# Altium schematic symbol library BARKO_SCHLIB.SchLib: 1064 symbols (part 1 of 11) (continued)
## C-220NF-1812 (continued)
CAP CER 0.22UF 100V X7R 1812; Manufacturer: KEMET; Manufacturer Part Number: C1812C224K1RACTU; Dielectric Material: Ceramic; Tolerance: 10%; Dissipation Factor: 2.5%; .PCBCHK: USED; .Creator: F:TALI; Washability: OK; Stock 1: 2000; Pricing 1: 1=1.08, 10=0.822, 100=0.5882, 500=0.4554 (USD); Mount: Surface Mount; Case Code (Metric): 4532; Case Code (Imperial): 1812; Min Operating Temperature: -55°C; Max Operating Temperature: 125°C; Capacitance: 220nF; Packaging: Tape and Reel; Package Quantity: 1000; Voltage Rating (DC): 100V; Dielectric: X7R; Termination: SMD/SMT; Voltage: 100V; Length: 4.5mm; Height: 1mm; Width: 0.126inch; Thickness: 0.043inch; Depth: 3.2mm; ComponentLink1URL: http://www.mouser.com/ds/2/212/KEM_C1002_X7R_SMD-1102033.pdf; ComponentLink1Description: http://www.mouser.com/ds/2/212/KEM_C1002_X7R_SMD-1102033.pdf; Stock 2: 4970; Pricing 2: 1=1.02, 10=0.773, 100=0.5533, 500=0.42836 (USD); Weight: 0.000952oz; Composition: Ceramic; Radiation Hardening: No; Lead Free: Lead Free; ComponentLink2URL: https://www.verical.com/server-webapp/html/getDatasheet?partID=403886; ComponentLink2Description: https://www.verical.com/server-webapp/html/getDatasheet?partID=403886; ComponentLink3URL: http://www.yageo.com/documents/recent/UPY-NP0X7R_MV_100-to-630V_9.pdf; ComponentLink3Description: http://www.yageo.com/documents/recent/UPY-NP0X7R_MV_100-to-630V_9.pdf; ComponentLink4URL: http://www.mouser.com/ds/2/447/Yageo_UPY-GP_NP0_16V-to-50V_9-358835.pdf; ComponentLink4Description: http://www.mouser.com/ds/2/447/Yageo_UPY-GP_NP0_16V-to-50V_9-358835.pdf; Stock 3: 2410; Pricing 3: 1=1.59, 10=1.252, 100=0.939, 500=0.70944 (USD); Features: Soft Termination; .SCHCHK: USED; Supplier 1: Digi-Key; Supplier Part Number 1: 399-9430-6-ND
pins: 1, 2

## C-220PF-0603
designator C?, comment 220PF  Voltage Rating: 50V  Case/Package: 0603
CAP CER 220PF 50V X7R 0603; Manufacturer: Samsung; Manufacturer Part Number: CL10B221JB8NNNC; Tolerance: 5%; Dielectric Material: Ceramic; Dissipation Factor: 2.5%; .PCBCHK: USED; .Creator: F:TALI; Washability: OK; Stock 1: 20; Pricing 1: 1=0.1, 10=0.068, 100=0.0305, 500=0.02178, 1000=0.01712 (USD); Mount: Surface Mount; Case Code (Metric): 1608; Min Operating Temperature: -55°C; Max Operating Temperature: 125°C; Packaging: Tape and Reel; Capacitance: 220pF; Package Quantity: 1; Dielectric: X7R; Voltage Rating (DC): 50V; Length: 1.6mm; Height: 0.8mm; Width: 0.031inch; Thickness: 0.035inch; Depth: 0.8mm; Radiation Hardening: No; ComponentLink1URL: https://www.verical.com/server-webapp/html/getDatasheet?partID=781787; ComponentLink1Description: https://www.verical.com/server-webapp/html/getDatasheet?partID=781787; Case Code (Imperial): 0603; Stock 2: 12000; Pricing 2: 1=0.13, 10=0.095, 100=0.0422, 500=0.03012, 1000=0.02367 (USD); Weight: 7.1E-05oz; Termination: SMD/SMT; Composition: Ceramic; Lead Free: Lead Free; Halogen Free: Halogen Free; ComponentLink2URL: http://www.yageo.com/documents/recent/UPY-GPHC_X7R_6.3V-to-50V_8.pdf; ComponentLink2Description: http://www.yageo.com/documents/recent/UPY-GPHC_X7R_6.3V-to-50V_8.pdf; Stock 3: 1679; Pricing 3: 1=0.51, 10=0.351, 100=0.2105, 500=0.15784, 1000=0.13329 (USD); Lead Pitch: 0.7mm; ComponentLink3URL: http://www.mouser.com/ds/2/212/KEM_C1002_X7R_SMD-1102033.pdf; ComponentLink3Description: http://www.mouser.com/ds/2/212/KEM_C1002_X7R_SMD-1102033.pdf; .SCHCHK: USED; Supplier 1: Digi-Key; Supplier Part Number 1: 1276-1985-6-ND
footprint C-0603
pins: 1, 2

## C-220UF-RADIAL SMD
designator C?, comment 220UF  Case/Package: Radial  Voltage Rating: 16V
CAP ALUM 220UF 20% 16V SMD; Manufacturer: Panasonic; Manufacturer Part Number: EEE-1CA221UP; Ripple Current (AC): 280mA; Life (Hours): 2000Hour; Leakage Current: 3uA; Dielectric Material: Aluminium; Impedance: 180mR; Dissipation Factor: 0.16%; .PCBCHK: USED; .Creator: F:TALI; Washability: OK; Stock 1: 69049; Pricing 1: 1=0.48, 10=0.339, 100=0.223, 500=0.16518 (USD); Mount: PCB,Surface Mount; Min Operating Temperature: -40°C; Max Operating Temperature: 85°C; Capacitance: 220uF; Tolerance: 20%; Packaging: Tape and Reel; Package Quantity: 1; Voltage Rating (DC): 16V; Termination: SMD/SMT; Voltage: 16V; Ripple Current: 280mA; Diameter: 6.3mm; Length: 6.5mm; Height: 10.2mm; Height - Seated (Max): 0.244inch; REACH SVHC: Unknown; Lead Free: Lead Free; ComponentLink1URL: http://www.farnell.com/datasheets/1800489.pdf; ComponentLink1Description: http://www.farnell.com/datasheets/1800489.pdf; ComponentLink2URL: http://components.arrow.com/part/dataview/41790773S9646858N1386; ComponentLink2Description: http://components.arrow.com/part/dataview/41790773S9646858N1386; Stock 2: 2294; Pricing 2: 1=0.75, 10=0.531, 100=0.3495, 500=0.25888 (USD); Number of Pins: 2; ESR (Equivalent Series Resistance): 180mR; ComponentLink3URL: http://nichicon-us.com/english/products/pdfs/e-ucl.pdf; ComponentLink3Description: http://nichicon-us.com/english/products/pdfs/e-ucl.pdf; Stock 3: 18022; Pricing 3: 1=0.77, 10=0.571, 100=0.3912, 500=0.30972 (USD); Contact Plating: Tin; Lead Pitch: 2.2mm; Radiation Hardening: No; ComponentLink4URL: http://www.farnell.com/datasheets/2059678.pdf; ComponentLink4Description: http://www.farnell.com/datasheets/2059678.pdf; ComponentLink5URL: http://uk.rs-online.com/webdocs/0df0/0900766b80df09a1.pdf; ComponentLink5Description: http://uk.rs-online.com/webdocs/0df0/0900766b80df09a1.pdf; ComponentLink6URL: http://www.farnell.com/datasheets/2244690.pdf; ComponentLink6Description: http://www.farnell.com/datasheets/2244690.pdf; ComponentLink7URL: https://www.alliedelec.com/m/d/f9a8f3530578bb19547681b1320b60ff.pdf; ComponentLink7Description: https://www.alliedelec.com/m/d/f9a8f3530578bb19547681b1320b60ff.pdf; ComponentLink8URL: http://industrial.panasonic.com/www-data/pdf/ABA0000/ABA0000CE114.pdf; ComponentLink8Description: http://industrial.panasonic.com/www-data/pdf/ABA0000/ABA0000CE114.pdf; ComponentLink9URL: https://www.distrelec.biz/Web/Downloads/_t/ds/fp_eng_tds.pdf?mime=application%2Fpdf; ComponentLink9Description: https://www.distrelec.biz/Web/Downloads/_t/ds/fp_eng_tds.pdf?mime=application%2Fpdf; .SCHCHK: USED; Supplier 1: Digi-Key; Supplier Part Number 1: PCE3884DKR-ND
footprint C-E-8.3x8.3x10.2
pins: 1, 2
text: +

## C-220UF-TANTB
designator C?, comment 220uF  Case/Package: 1411
CAP TANT 220UF 10% 6.3V 1411; Manufacturer: Kyocera AVX; Manufacturer Part Number: F930J227KBA; Washability: OK; .Creator: M.OZKAN; .PCBCHK: USED; ESR (Equivalent Series Resistance): 1.2R; Life (Hours): 2000Hour; .SCHCHK: USED; Supplier 1: Digi-Key; Supplier Part Number 1: 478-8166-1-ND; Stock: 10160; Pricing: 1=0.78, 10=0.572, 50=0.4576, 100=0.3922, 500=0.3105, 1000=0.2614 (USD); RoHS: No; Mount: Surface Mount; Case Code (Imperial): 1411; Case Code (Metric): 3528; Min Operating Temperature: -55°C; Max Operating Temperature: 125°C; Features: General Purpose; Packaging: Tape and Reel; Capacitance: 220uF; Tolerance: 10%; Voltage Rating: 6.3V; ComponentLink1URL: http://www.mouser.com/ds/2/40/f93-776559.pdf?src-supplier=Mouser; ComponentLink1Description: http://www.mouser.com/ds/2/40/f93-776559.pdf?src-supplier=Mouser; ComponentLink2URL: http://datasheets.avx.com/F93.pdf?src-supplier=Digi-Key; ComponentLink2Description: http://datasheets.avx.com/F93.pdf?src-supplier=Digi-Key
footprint C-TANTB-3528
pins: 1, 2
text: +

## C-330PF-0603
designator C?, comment 330PF  Voltage Rating: 100V  Case/Package: 0603
CAP CER 330PF 100V X7R 0603; Manufacturer: Samsung; Manufacturer Part Number: CL10B331KC8WPNC; Tolerance: 10%; .PCBCHK: USED; .Creator: F:TALI; Washability: OK; Stock 1: 0; Pricing 1: 4000=0.01369 (USD); Mount: Surface Mount; Case Code (Metric): 1608; Case Code (Imperial): 0603; Min Operating Temperature: -55°C; Max Operating Temperature: 125°C; Packaging: Cut Tape; Capacitance: 330pF; Features: Soft Termination; Length: 0.063inch; Width: 0.031inch; Thickness: 0.035inch; Ratings: AEC-Q200; Stock 2: 1430; Pricing 2: 1=0.1, 10=0.03, 100=0.0271, 500=0.02396 (USD); Stock 3: 80; Pricing 3: 1=0.14, 10=0.1, 100=0.0443, 500=0.03166, 1000=0.02488 (USD); Weight: 7.1E-05oz; Dielectric: X7R; Voltage Rating (DC): 100V; Termination: SMD/SMT; Composition: Ceramic; Height: 0.8mm; Depth: 0.8mm; Radiation Hardening: No; ComponentLink1URL: http://www.mouser.com/ds/2/447/Yageo_UPY-GP_NP0_16V-to-50V_9-358835.pdf; ComponentLink1Description: http://www.mouser.com/ds/2/447/Yageo_UPY-GP_NP0_16V-to-50V_9-358835.pdf; .SCHCHK: USED; Supplier 1: Digi-Key; Supplier Part Number 1: 732-12199-6-ND
footprint C-0603
pins: 1, 2

## C-330PF-0603_1
designator C?, comment 330PF  Voltage Rating: 50V  Case/Package: 0603
CAP CER 330PF 50V NP0 0603; Manufacturer: KEMET; Manufacturer Part Number: C0603C331J5GACTU; Dielectric Material: Ceramic; Tolerance: 5%; Dielectric: C0G; Temperature Coefficient: 30ppm/°C; Dissipation Factor: 0.5%; .PCBCHK: USED; .Creator: F:TALI; Washability: OK; Stock 1: 0; Pricing 1: 1=0.1, 10=0.073, 100=0.0324, 500=0.02314, 1000=0.01818 (USD); Mount: PCB,Surface Mount; Number of Pins: 2; Contact Plating: Matte,Tin; Case Code (Metric): 1608; Case Code (Imperial): 0603; Contact Material: Tin; Min Operating Temperature: -55°C; Max Operating Temperature: 125°C; Packaging: Tape and Reel; Termination: SMD/SMT; Package Quantity: 1; Voltage Rating (DC): 50V; Voltage: 50V; Length: 1.6mm; Height: 0.8mm; Width: 0.8mm; Depth: 0.8mm; Thickness: 0.034inch; Lead Pitch: 0.7mm; Radiation Hardening: No; REACH SVHC: No SVHC; Lead Free: Lead Free; ComponentLink1URL: https://api.kemet.com/component-edge/download/datasheet/C0603C331J5GACTU.pdf; ComponentLink1Description: https://api.kemet.com/component-edge/download/datasheet/C0603C331J5GACTU.pdf; ComponentLink2URL: https://www.alliedelec.com/m/d/9bfe7773041ffe9d406e68bc7b377fdd.pdf; ComponentLink2Description: https://www.alliedelec.com/m/d/9bfe7773041ffe9d406e68bc7b377fdd.pdf; ComponentLink3URL: http://www.kemet.com/kemet/web/homepage/kechome.nsf/file/Commercial%20Ceramic%20Chips%20NP0%20-%20C0G%20Dielectric/$file/KEM_C1003_C0G_SMD.pdf; ComponentLink3Description: http://www.kemet.com/kemet/web/homepage/kechome.nsf/file/Commercial%20Ceramic%20Chips%20NP0%20-%20C0G%20Dielectric/$file/KEM_C1003_C0G_SMD.pdf; Capacitance: 330pF; Stock 2: 4; Pricing 2: 1=0.1, 10=0.07, 100=0.031, 500=0.02214, 1000=0.01739 (USD); ComponentLink4URL: http://www.samsungsem.com/kr/support/product-search/mlcc/CL10C331JB8NFNC.jsp; ComponentLink4Description: http://www.samsungsem.com/kr/support/product-search/mlcc/CL10C331JB8NFNC.jsp; Stock 3: 2878; Pricing 3: 1=0.1, 10=0.038, 100=0.0345, 500=0.0305 (USD); .SCHCHK: USED; Supplier 1: Digi-Key; Supplier Part Number 1: 399-1068-6-ND
footprint C-0603
pins: 1, 2

## C-330UF-RADIAL SMD
designator C?, comment 330UF  Voltage Rating: 35V  Case/Package: Radial
CAP ALUM 330UF 20% 35V SMD; Manufacturer: Panasonic; Manufacturer Part Number: EEE-1VA331P; Ripple Current (AC): 350mA; Polarity: Polar; Life (Hours): 2000Hour; Leakage Current: 3uA; Dissipation Factor: 0.3%; Lead Diameter: 0.9mm; Material: Aluminium; ESR (Equivalent Series Resistance): 150mR; .PCBCHK: USED; .Creator: F:TALI; Washability: OK; Stock 1: 26248; Pricing 1: 1=0.65, 10=0.482, 100=0.3304 (USD); Mount: PCB,Surface Mount; Contact Plating: Tin; Min Operating Temperature: -40°C; Max Operating Temperature: 85°C; Capacitance: 330uF; Packaging: Tape and Reel; Tolerance: 20%; Ripple Current: 350mA; Voltage Rating (DC): 35V; Package Quantity: 500; Termination: SMD/SMT; Voltage: 35V; Diameter: 10mm; Length: 10.5mm; Height: 10.2mm; Height - Seated (Max): 0.402inch; Radiation Hardening: No; REACH SVHC: No SVHC; Lead Free: Lead Free; ComponentLink1URL: http://industrial.panasonic.com/www-data/pdf/ABA0000/ABA0000CE2.pdf; ComponentLink1Description: http://industrial.panasonic.com/www-data/pdf/ABA0000/ABA0000CE2.pdf; ComponentLink2URL: http://www.farnell.com/datasheets/2245251.pdf; ComponentLink2Description: http://www.farnell.com/datasheets/2245251.pdf; ComponentLink3URL: https://www.alliedelec.com/m/d/310b2cfd0553a89b5ffae819c6e32d0a.pdf; ComponentLink3Description: https://www.alliedelec.com/m/d/310b2cfd0553a89b5ffae819c6e32d0a.pdf; ComponentLink4URL: http://www.mouser.com/ds/2/315/ABA0000C1145-947633.pdf; ComponentLink4Description: http://www.mouser.com/ds/2/315/ABA0000C1145-947633.pdf; ComponentLink5URL: http://www.industrial.panasonic.com/www-data/pdf/ABA0000/ABA0000CE2.pdf; ComponentLink5Description: http://www.industrial.panasonic.com/www-data/pdf/ABA0000/ABA0000CE2.pdf; ComponentLink6URL: http://www.farnell.com/datasheets/1909355.pdf; ComponentLink6Description: http://www.farnell.com/datasheets/1909355.pdf; Stock 2: 1224; Pricing 2: 1=0.74, 10=0.548, 100=0.3756 (USD); Lead Pitch: 4.6mm; ComponentLink7URL: http://www.farnell.com/datasheets/2059976.pdf; ComponentLink7Description: http://www.farnell.com/datasheets/2059976.pdf; ComponentLink8URL: http://industrial.panasonic.com/www-data/pdf/ABA0000/ABA0000CE115.pdf; ComponentLink8Description: http://industrial.panasonic.com/www-data/pdf/ABA0000/ABA0000CE115.pdf; Stock 3: 21574; Pricing 3: 1=0.8, 10=0.592, 100=0.4057 (USD); Impedance: 150mR; Width: 900um; ComponentLink9URL: http://uk.rs-online.com/webdocs/0e4a/0900766b80e4a876.pdf; ComponentLink9Description: http://uk.rs-online.com/webdocs/0e4a/0900766b80e4a876.pdf; ComponentLink10URL: http://industrial.panasonic.com/www-data/pdf/ABA0000/ABA0000CE5.pdf; ComponentLink10Description: http://industrial.panasonic.com/www-data/pdf/ABA0000/ABA0000CE5.pdf; ComponentLink11URL: https://www.alliedelec.com/m/d/5e395ce182861cdd9b9c36695bed6c89.pdf; ComponentLink11Description: https://www.alliedelec.com/m/d/5e395ce182861cdd9b9c36695bed6c89.pdf; ComponentLink12URL: https://www.alliedelec.com/m/d/ad9eed8922c31d260fc5efb233f3771b.pdf; ComponentLink12Description: https://www.alliedelec.com/m/d/ad9eed8922c31d260fc5efb233f3771b.pdf; .SCHCHK: USED; Supplier 1: Digi-Key; Supplier Part Number 1: PCE3959DKR-ND
pins: 1, 2
text: +

## C-330UF-RADIAL-50V
designator C?, comment 330UF  Voltage Rating: 50V
CAP ALUM 330UF 20% 50V SMD; Manufacturer: Nichicon; Manufacturer Part Number: UCM1H331MNL1GS; Ripple Current: 900mA; Polarity: Polar; Impedance: 120mR; Life (Hours): 2000Hour; Supplier 1: Digi-Key; Supplier Part Number 1: 493-14535-1-ND; Stock: 3199; Pricing: 1=0.92, 10=0.701, 50=0.5824, 100=0.5015 (USD); RoHS: Yes; Mount: Surface Mount; Case/Package: SMD/SMT; Min Operating Temperature: -55°C; Max Operating Temperature: 105°C; Capacitance: 330uF; Voltage Rating (DC): 50V; Tolerance: 20%; Packaging: Tape and Reel; Package Quantity: 500; Termination: SMD/SMT; Voltage: 50V; Diameter: 10mm; Length: 10mm; Height: 10mm; Height - Seated (Max): 0.413inch; Lead Pitch: 4.5mm; Lead Free: Lead Free; ComponentLink1URL: http://www.mouser.com/ds/2/293/e-ucm-883824.pdf?src-supplier=Mouser; ComponentLink1Description: http://www.mouser.com/ds/2/293/e-ucm-883824.pdf?src-supplier=Mouser; ComponentLink2URL: http://uk.rs-online.com/webdocs/13bc/0900766b813bca52.pdf?src-supplier=RSComponents; ComponentLink2Description: http://uk.rs-online.com/webdocs/13bc/0900766b813bca52.pdf?src-supplier=RSComponents; ComponentLink3URL: http://nichicon-us.com/english/products/pdfs/e-ch_ta.pdf?src-supplier=Digi-Key; ComponentLink3Description: http://nichicon-us.com/english/products/pdfs/e-ch_ta.pdf?src-supplier=Digi-Key; ComponentLink4URL: http://nichicon-us.com/english/products/pdfs/e-ucm.pdf?src-supplier=Digi-Key; ComponentLink4Description: http://nichicon-us.com/english/products/pdfs/e-ucm.pdf?src-supplier=Digi-Key
footprint C-E-10.3x10.3x10.5
pins: 1, 2
text: +

## C-330UF-Radial-63V
designator C?, comment 330UF  Case/Package: Radial  Voltage Rating: 63V
CAP ALUM 330UF 20% 63V SMD; Manufacturer: Nichicon; Manufacturer Part Number: UUG1J331MNQ6MS; Ripple Current: 680mA; Life (Hours): 2000Hour; Leakage Current: 4uA; Washability: OK; .Creator: M.OZKAN; .PCBCHK: USED; Supplier 1: Digi-Key; Supplier Part Number 1: 493-7427-1-ND; Stock 1: 133; Pricing 1: 1=1.25000, 10=0.98600 (USD); RoHS: Yes; Mount: Surface Mount; Min Operating Temperature: -40°C; Max Operating Temperature: 85°C; Capacitance: 330uF; Package Quantity: 1; Packaging: Tape and Reel; Voltage Rating (DC): 63V; Tolerance: 20%; Termination: SMD/SMT; Length: 21mm; Height - Seated (Max): 0.866inch; ComponentLink1URL: https://datasheet.ciiva.com/6316/e-ug-6316181.pdf?src-supplier=Digi-Key; ComponentLink1Description: https://datasheet.ciiva.com/6316/e-ug-6316181.pdf?src-supplier=Digi-Key; ComponentLink2URL: https://datasheet.ciiva.com/6316/e-ug-6316175.pdf?src-supplier=Digi-Key; ComponentLink2Description: https://datasheet.ciiva.com/6316/e-ug-6316175.pdf?src-supplier=Digi-Key; .SCHCHK: USED
footprint C-E-12.5X21L
pins: 1, 2
text: +

## C-470NF-0603
designator C?, comment 470NF  Case/Package: 0603  Voltage Rating: 16V
CAP CER 0.47UF 16V X7R 0603; Manufacturer: Samsung; Manufacturer Part Number: CL10B474KO8VPNC; Tolerance: 10%; Dielectric Material: Ceramic; .PCBCHK: USED; .Creator: F:TALI; Washability: OK; Mount: Surface Mount; Case Code (Metric): 1608; Case Code (Imperial): 0603; Min Operating Temperature: -55°C; Max Operating Temperature: 125°C; Packaging: Tape and Reel; Capacitance: 470nF; Features: Soft Termination; Length: 0.063inch; Width: 0.031inch; Thickness: 0.035inch; Ratings: AEC-Q200; Stock 1: 0; Pricing 1: 1=0.24, 10=0.166, 100=0.0839, 500=0.0574, 1000=0.05078 (USD); Contact Plating: Matte,Tin; Dielectric: X7R; Voltage Rating (DC): 16V; Height: 0.8mm; Depth: 0.8mm; Radiation Hardening: No; REACH SVHC: No SVHC; ComponentLink1URL: http://capacitoredge.kemet.com/capedge2/DataSheet?pn=C0603C474K4RACAUTO; ComponentLink1Description: http://capacitoredge.kemet.com/capedge2/DataSheet?pn=C0603C474K4RACAUTO; Stock 2: 4000; Pricing 2: 1=0.13, 10=0.093, 100=0.0438, 500=0.0307, 1000=0.02541 (USD); Number of Pins: 2; Package Quantity: 1; Termination: SMD/SMT; Voltage: 16V; Halogen Free: Halogen Free; ComponentLink2URL: http://www.onlinecomponents.com/productFiles/mf-TAI/398emk107b7474ka-t.pdf; ComponentLink2Description: http://www.onlinecomponents.com/productFiles/mf-TAI/398emk107b7474ka-t.pdf; ComponentLink3URL: http://ds.yuden.co.jp/TYCOMPAS/ut/detail.do?productNo=EMK107B7474KA-T&fileName=EMK107B7474KA-T_SS&mode=specSheetDownload; ComponentLink3Description: http://ds.yuden.co.jp/TYCOMPAS/ut/detail.do?productNo=EMK107B7474KA-T&fileName=EMK107B7474KA-T_SS&mode=specSheetDownload; ComponentLink4URL: https://www.verical.com/server-webapp/html/getDatasheet?partID=638870; ComponentLink4Description: https://www.verical.com/server-webapp/html/getDatasheet?partID=638870; ComponentLink5URL: http://www.farnell.com/datasheets/746258.pdf; ComponentLink5Description: http://www.farnell.com/datasheets/746258.pdf; ComponentLink6URL: http://www.yuden.co.jp/ut/product/category/capacitor/EMK107B7474KA-T.pdf; ComponentLink6Description: http://www.yuden.co.jp/ut/product/category/capacitor/EMK107B7474KA-T.pdf; Stock 3: 40000; Pricing 3: 1=0.14, 10=0.1, 100=0.0472, 500=0.03312, 1000=0.02742 (USD); .SCHCHK: USED; Supplier 1: Digi-Key; Supplier Part Number 1: 1276-6604-6-ND
footprint C-0603
pins: 1, 2

## C-470NF-0603_1
designator C?, comment 470NF  Voltage Rating: 50V  Case/Package: 0603
CAP CER 0.47UF 50V X5R 0603; Manufacturer: Samsung; Manufacturer Part Number: CL10A474KB8NNNC; Tolerance: 10%; .PCBCHK: USED; .Creator: F:TALI; Washability: OK; Stock 1: 40000; Pricing 1: 1=0.33, 10=0.227, 100=0.115, 500=0.07868, 1000=0.0696 (USD); Mount: Surface Mount; Case Code (Metric): 1608; Case Code (Imperial): 0603; Min Operating Temperature: -55°C; Max Operating Temperature: 85°C; Packaging: Tape and Reel; Capacitance: 470nF; Package Quantity: 1; Dielectric: X5R; Voltage Rating (DC): 50V; Length: 1.6mm; Height: 0.8mm; Width: 0.031inch; Thickness: 0.035inch; Depth: 0.8mm; Radiation Hardening: No; Lead Free: Lead Free; ComponentLink1URL: https://www.verical.com/server-webapp/html/getDatasheet?partID=353290; ComponentLink1Description: https://www.verical.com/server-webapp/html/getDatasheet?partID=353290; ComponentLink2URL: http://www.samsungsem.com/kr/support/library/product-catalog/mlcc.jsp; ComponentLink2Description: http://www.samsungsem.com/kr/support/library/product-catalog/mlcc.jsp; Stock 2: 4000; Pricing 2: 1=0.22, 10=0.156, 100=0.0732, 500=0.05132, 1000=0.04248 (USD); Termination: SMD/SMT; Voltage: 50V; ComponentLink3URL: http://www.yuden.co.jp/productdata/catalog/en/mlcc_all_e.pdf; ComponentLink3Description: http://www.yuden.co.jp/productdata/catalog/en/mlcc_all_e.pdf; ComponentLink4URL: http://www.onlinecomponents.com/productFiles/mf-TAI/30umk107abj474ka-t.pdf; ComponentLink4Description: http://www.onlinecomponents.com/productFiles/mf-TAI/30umk107abj474ka-t.pdf; ComponentLink5URL: http://ds.yuden.co.jp/TYCOMPAS/ut/detail.do?productNo=UMK107ABJ474KA-T&fileName=UMK107ABJ474KA-T_SS&mode=specSheetDownload; ComponentLink5Description: http://ds.yuden.co.jp/TYCOMPAS/ut/detail.do?productNo=UMK107ABJ474KA-T&fileName=UMK107ABJ474KA-T_SS&mode=specSheetDownload; ComponentLink6URL: http://www.yuden.co.jp/or/product/category/capacitor/UMK107ABJ474KA-T.pdf; ComponentLink6Description: http://www.yuden.co.jp/or/product/category/capacitor/UMK107ABJ474KA-T.pdf; .SCHCHK: USED; Supplier 1: Digi-Key; Supplier Part Number 1: 1276-1896-6-ND
footprint C-0603
pins: 1, 2

## C-470NF-0805
designator C?, comment 470NF  Voltage Rating: 50V  Case Code (Imperial): 0805
CAP CER 0.47UF 50V X7R 0805; Manufacturer: Samsung; Manufacturer Part Number: CL21B474KBFNNNE; Tolerance: 10%; Dielectric Material: Ceramic; .PCBCHK: USED; .Creator: F:TALI; Washability: OK; Stock 1: 0; Pricing 1: 1=0.3, 10=0.203, 100=0.1027, 500=0.0703, 1000=0.06219 (USD); Mount: Surface Mount; Case/Package: 0805; Case Code (Metric): 2012; Min Operating Temperature: -55°C; Max Operating Temperature: 125°C; Capacitance: 470nF; Dielectric: X7R; Packaging: Tape and Reel; Package Quantity: 1; Voltage Rating (DC): 50V; Voltage: 50V; Length: 2mm; Height: 1.25mm; Width: 0.049inch; Thickness: 0.053inch; Depth: 1.25mm; Radiation Hardening: No; Lead Free: Lead Free; ComponentLink1URL: https://www.verical.com/server-webapp/html/getDatasheet?partID=554230; ComponentLink1Description: https://www.verical.com/server-webapp/html/getDatasheet?partID=554230; ComponentLink2URL: http://www.samsungsem.com/kr/front/downloadcms.do?path=/kr/support/product-search/mlcc/__icsFiles/afieldfile/2014/11/05&fileName=C_CL21B474KBFNNNE.pdf; ComponentLink2Description: http://www.samsungsem.com/kr/front/downloadcms.do?path=/kr/support/product-search/mlcc/__icsFiles/afieldfile/2014/11/05&fileName=C_CL21B474KBFNNNE.pdf; Stock 2: 20000; Pricing 2: 1=0.29, 10=0.198, 100=0.112, 500=0.07906, 1000=0.06917 (USD); Features: Soft Termination; Ratings: AEC-Q200; Stock 3: 30000; Pricing 3: 1=0.33, 10=0.229, 100=0.1295, 500=0.09142, 1000=0.07998 (USD); Number of Pins: 2; Contact Plating: Matte,Tin; Termination: SMD/SMT; REACH SVHC: No SVHC; ComponentLink3URL: http://www.mouser.com/ds/2/40/X7RDielectric-777024.pdf; ComponentLink3Description: http://www.mouser.com/ds/2/40/X7RDielectric-777024.pdf; ComponentLink4URL: https://www.avx.com/docs/Catalogs/flexiterm.pdf; ComponentLink4Description: https://www.avx.com/docs/Catalogs/flexiterm.pdf; ComponentLink5URL: http://www.farnell.com/datasheets/319609.pdf; ComponentLink5Description: http://www.farnell.com/datasheets/319609.pdf; .SCHCHK: USED; Supplier 1: Digi-Key; Supplier Part Number 1: 1276-1039-6-ND
footprint C-0805
pins: 1, 2

## C-470PF-0402
designator C?, comment 470PF  Voltage Rating: 50V  Case/Package: 0402
CAP CER 470PF 50V C0G/NP0 0402; Manufacturer: Murata; Manufacturer Part Number: GRM1555C1H471JA-01D; Material: Ceramic; Tolerance: 5%; Dielectric: C0G; Insulation Resistance: 10GR; Temperature Coefficient: 30ppm/°C; .PCBCHK: USED; .Creator: F:TALI; Washability: OK; Stock 1: 100000; Pricing 1: 1=0.13, 10=0.094, 100=0.0444, 500=0.03114, 1000=0.02579, 2500=0.024, 5000=0.02196 (USD); Mount: Surface Mount; Number of Pins: 2; Case Code (Imperial): 0402; Case Code (Metric): 1005; Dielectric Material: Ceramic; Min Operating Temperature: -55°C; Max Operating Temperature: 125°C; Capacitance: 470pF; Packaging: Tape and Reel; Voltage Rating (DC): 50V; Package Quantity: 1; Termination: SMD/SMT; Voltage: 50V; Length: 1mm; Height: 0.5mm; Width: 0.5mm; Thickness: 0.022inch; Depth: 0.5mm; Radiation Hardening: No; REACH SVHC: No SVHC; Lead Free: Lead Free; ComponentLink1URL: http://www.farnell.com/datasheets/4360.pdf; ComponentLink1Description: http://www.farnell.com/datasheets/4360.pdf; ComponentLink2URL: https://www.murata.com/~/media/webrenewal/support/library/catalog/products/capacitor/mlcc/c02e.ashx?la=en-us; ComponentLink2Description: https://www.murata.com/~/media/webrenewal/support/library/catalog/products/capacitor/mlcc/c02e.ashx?la=en-us; ComponentLink3URL: https://www.murata.com/~/media/webrenewal/support/library/catalog/products/capacitor/mlcc/c02e.ashx; ComponentLink3Description: https://www.murata.com/~/media/webrenewal/support/library/catalog/products/capacitor/mlcc/c02e.ashx; ComponentLink4URL: http://psearch.murata.com/capacitor/product/GRM1555C1H471JA01%23.pdf; ComponentLink4Description: http://psearch.murata.com/capacitor/product/GRM1555C1H471JA01%23.pdf; ComponentLink5URL: https://produktinfo.conrad.com/datenblaetter/450000-474999/453898-da-01-en-VS_KONDENSATOR_0402.pdf; ComponentLink5Description: https://produktinfo.conrad.com/datenblaetter/450000-474999/453898-da-01-en-VS_KONDENSATOR_0402.pdf; Stock 2: 10000; Pricing 2: 1=0.1, 10=0.076, 100=0.0338, 500=0.02416, 1000=0.01898, 2500=0.01725, 5000=0.01587 (USD); Ratings: AEC-Q200; Halogen Free: Halogen Free; Stock 3: 961; Pricing 3: 1=0.1, 10=0.068, 100=0.0304, 500=0.02172, 1000=0.01706, 2500=0.01551, 5000=0.01427 (USD); Weight: 2.3E-05oz; Composition: Ceramic; ComponentLink6URL: http://www.mouser.com/ds/2/400/lcc_automotive_general_en-843974.pdf; ComponentLink6Description: http://www.mouser.com/ds/2/400/lcc_automotive_general_en-843974.pdf; ComponentLink7URL: http://www.farnell.com/datasheets/1807242.pdf; ComponentLink7Description: http://www.farnell.com/datasheets/1807242.pdf; .SCHCHK: USED; Supplier 1: Digi-Key; Supplier Part Number 1: 490-1297-6-ND
footprint C-0402
pins: 1, 2

## C-470PF-0603
designator C?, comment 470PF  Voltage Rating: 100V  Case/Package: 0603
CAP CER 470PF 100V C0G/NP0 0603; Manufacturer: Murata; Manufacturer Part Number: GCM1885C2A471JA16D; Dielectric: C0G; Tolerance: 5%; Washability: OK; .Creator: M.OZKAN; .PCBCHK: USED; Supplier 1: Digi-Key; Supplier Part Number 1: 490-4949-1-ND; Stock 1: 258128; Pricing 1: 1=0.22000, 10=0.15300, 100=0.07760, 500=0.05308, 1000=0.04695 (USD); RoHS: Yes; Mount: Surface Mount; Case Code (Imperial): 0603; Case Code (Metric): 1608; Min Operating Temperature: -55°C; Max Operating Temperature: 125°C; Capacitance: 470pF; Packaging: Tape and Reel; Voltage Rating (DC): 100V; Package Quantity: 4000; Termination: SMD/SMT; Length: 1.6mm; Height: 0.8mm; Depth: 0.8mm; Width: 0.031inch; Thickness: 0.035inch; Ratings: AEC-Q200; Radiation Hardening: No; Lead Free: Lead Free; ComponentLink1URL: https://datasheet.ciiva.com/134/product-134107.pdf?src-supplier=Digi-Key; ComponentLink1Description: https://datasheet.ciiva.com/134/product-134107.pdf?src-supplier=Digi-Key; ComponentLink2URL: https://datasheet.ciiva.com/134/product-134108.pdf?src-supplier=Digi-Key; ComponentLink2Description: https://datasheet.ciiva.com/134/product-134108.pdf?src-supplier=Digi-Key; ComponentLink3URL: https://datasheet.ciiva.com/134/product-134109.pdf?src-supplier=Digi-Key; ComponentLink3Description: https://datasheet.ciiva.com/134/product-134109.pdf?src-supplier=Digi-Key; ComponentLink4URL: https://datasheet.ciiva.com/2989/product-2989240.pdf?src-supplier=Avnet; ComponentLink4Description: https://datasheet.ciiva.com/2989/product-2989240.pdf?src-supplier=Avnet; .SCHCHK: USED
footprint C-0603
pins: 1, 2

## C-470PF-0805
designator C?, comment 470PF  Voltage Rating: 50V  Case Code (Imperial): 0805
CAP CER 470PF 50V X7R 0805; Manufacturer: Samsung; Manufacturer Part Number: CL21B471JBANNNC; Tolerance: 5%; Dissipation Factor: 2.5%; .PCBCHK: USED; .Creator: F:TALI; Washability: OK; Stock 1: 0; Pricing 1: 1=0.13, 10=0.096, 100=0.0426, 500=0.03046, 1000=0.02393 (USD); Mount: Surface Mount; Case/Package: 0805; Case Code (Metric): 2012; Min Operating Temperature: -55°C; Max Operating Temperature: 125°C; Capacitance: 470pF; Packaging: Tape and Reel; Package Quantity: 1; Dielectric: X7R; Voltage: 50V; Voltage Rating (DC): 50V; Length: 2mm; Height: 0.65mm; Width: 0.049inch; Thickness: 0.03inch; Depth: 1.25mm; Radiation Hardening: No; Lead Free: Lead Free; ComponentLink1URL: https://www.verical.com/server-webapp/html/getDatasheet?partID=643100; ComponentLink1Description: https://www.verical.com/server-webapp/html/getDatasheet?partID=643100; Stock 2: 489; Pricing 2: 1=0.2, 10=0.144, 100=0.0677, 500=0.04746, 1000=0.03929 (USD); Weight: 0.000194oz; Termination: SMD/SMT; Composition: Ceramic; Halogen Free: Halogen Free; ComponentLink2URL: http://www.yageo.com/documents/recent/UPY-GPHC_X7R_6.3V-to-50V_8.pdf; ComponentLink2Description: http://www.yageo.com/documents/recent/UPY-GPHC_X7R_6.3V-to-50V_8.pdf; ComponentLink3URL: http://www.mouser.com/ds/2/447/Yageo_UPY-GP_NP0_16V-to-50V_9-358835.pdf; ComponentLink3Description: http://www.mouser.com/ds/2/447/Yageo_UPY-GP_NP0_16V-to-50V_9-358835.pdf; Stock 3: 161; Pricing 3: 1=0.36, 10=0.25, 100=0.1417, 500=0.10006, 1000=0.08754 (USD); Number of Pins: 2; Contact Plating: Matte,Tin; REACH SVHC: Unknown; ComponentLink4URL: http://www.avx.com/docs/catalogs/cx7r.pdf; ComponentLink4Description: http://www.avx.com/docs/catalogs/cx7r.pdf; ComponentLink5URL: http://datasheets.avx.com/X7RDielectric.pdf; ComponentLink5Description: http://datasheets.avx.com/X7RDielectric.pdf; ComponentLink6URL: http://catalogs.avx.com/SurfaceMount.pdf; ComponentLink6Description: http://catalogs.avx.com/SurfaceMount.pdf; ComponentLink7URL: http://www.mouser.com/ds/2/40/X7RDielectric-777024.pdf; ComponentLink7Description: http://www.mouser.com/ds/2/40/X7RDielectric-777024.pdf; .SCHCHK: USED; Supplier 1: Digi-Key; Supplier Part Number 1: 311-4279-6-ND
footprint C-0805
pins: 1, 2

## C-680NF-1206
designator C?, comment 680NF  Voltage Rating: 50V  Case Code (Imperial): 1206
CAP CER 0.68UF 50V X7R 1206; Manufacturer: KEMET; Manufacturer Part Number: C1206C684K5RACTU; Dielectric Material: Ceramic; Tolerance: 10%; Dissipation Factor: 2.5%; .PCBCHK: USED; .Creator: F:TALI; Washability: OK; Stock 1: 25000; Pricing 1: 1=0.43, 10=0.297, 100=0.1781, 500=0.1336, 1000=0.11281 (USD); Mount: PCB,Surface Mount; Case/Package: 1206; Case Code (Metric): 3216; Min Operating Temperature: -55°C; Max Operating Temperature: 125°C; Packaging: Tape and Reel; Capacitance: 680nF; Voltage Rating (DC): 50V; Dielectric: X7R; Package Quantity: 1; Termination: SMD/SMT; Voltage: 50V; Length: 3.2mm; Height: 1mm; Depth: 1.6mm; Width: 1.6mm; Thickness: 0.043inch; REACH SVHC: No SVHC; ComponentLink1URL: http://www.mouser.com/ds/2/212/KEM_C1002_X7R_SMD-1102033.pdf; ComponentLink1Description: http://www.mouser.com/ds/2/212/KEM_C1002_X7R_SMD-1102033.pdf; ComponentLink2URL: https://www.alliedelec.com/m/d/9bfe7773041ffe9d406e68bc7b377fdd.pdf; ComponentLink2Description: https://www.alliedelec.com/m/d/9bfe7773041ffe9d406e68bc7b377fdd.pdf; Stock 2: 20000; Pricing 2: 1=0.36, 10=0.25, 100=0.1416, 500=0.09994, 1000=0.08744 (USD); Features: Soft Termination; Ratings: AEC-Q200; Stock 3: 13845; Pricing 3: 1=0.48, 10=0.331, 100=0.1989, 500=0.14914, 1000=0.12595 (USD); Lead Free: Lead Free; Halogen Free: Halogen Free; .SCHCHK: USED; Supplier 1: Digi-Key; Supplier Part Number 1: 399-3500-6-ND
footprint C-1206
pins: 1, 2

## C-680PF-0603
designator C?, comment 680PF  Voltage Rating: 50V  Case/Package: 0603
CAP CER 680PF 50V X7R 0603; Manufacturer: Samsung; Manufacturer Part Number: CL10B681JB8NNNC; Tolerance: 5%; Dielectric Material: Ceramic; Dissipation Factor: 2.5%; .PCBCHK: USED; .Creator: F:TALI; Washability: OK; Stock 1: 0; Pricing 1: 1=0.1, 10=0.064, 100=0.0285, 500=0.02034, 1000=0.01598 (USD); Mount: Surface Mount; Case Code (Metric): 1608; Case Code (Imperial): 0603; Min Operating Temperature: -55°C; Max Operating Temperature: 125°C; Capacitance: 680pF; Dielectric: X7R; Package Quantity: 1; Packaging: Tape and Reel; Voltage Rating (DC): 50V; Length: 1.6mm; Height: 0.8mm; Width: 0.031inch; Thickness: 0.035inch; Depth: 0.8mm; Radiation Hardening: No; Lead Free: Lead Free; ComponentLink1URL: https://media.digikey.com/pdf/Data%20Sheets/Samsung%20PDFs/CL_Series_MLCC_ds.pdf; ComponentLink1Description: https://media.digikey.com/pdf/Data%20Sheets/Samsung%20PDFs/CL_Series_MLCC_ds.pdf; ComponentLink2URL: http://www1.futureelectronics.com/doc/SAMSUNG/CLSERIES.pdf; ComponentLink2Description: http://www1.futureelectronics.com/doc/SAMSUNG/CLSERIES.pdf; Stock 2: 52; Pricing 2: 1=0.13, 10=0.095, 100=0.0422, 500=0.03012, 1000=0.02367 (USD); Halogen Free: Halogen Free; ComponentLink3URL: http://www.yageo.com/documents/recent/UPY-GPHC_X7R_6.3V-to-50V_8.pdf; ComponentLink3Description: http://www.yageo.com/documents/recent/UPY-GPHC_X7R_6.3V-to-50V_8.pdf; ComponentLink4URL: https://www.verical.com/server-webapp/html/getDatasheet?partID=782037; ComponentLink4Description: https://www.verical.com/server-webapp/html/getDatasheet?partID=782037; Stock 3: 3350; Pricing 3: 1=0.51, 10=0.351, 100=0.2105, 500=0.15784, 1000=0.13329 (USD); Termination: SMD/SMT; Lead Pitch: 0.7mm; ComponentLink5URL: http://www.mouser.com/ds/2/212/KEM_C1002_X7R_SMD-1102033.pdf; ComponentLink5Description: http://www.mouser.com/ds/2/212/KEM_C1002_X7R_SMD-1102033.pdf; .SCHCHK: USED; Supplier 1: Digi-Key; Supplier Part Number 1: 1276-1279-6-ND
footprint C-0603
pins: 1, 2

## C-680UF-RADIAL SMD
designator C?, comment 680UF  Voltage: 50V
CAP ALUM 680UF 20% 50V SMD; Manufacturer: Vishay BCcomponents; Manufacturer Part Number: MAL214699109E3; Ripple Current: 1.3A; Polarity: Polar; Leakage Current: 340uA; Life (Hours): 5000Hour; Impedance: 72mR; Lead Diameter: 1.3mm; ComponentLink1URL: http://www.farnell.com/datasheets/1800489.pdf; ComponentLink1Description: http://www.farnell.com/datasheets/1800489.pdf; ComponentLink2URL: http://components.arrow.com/part/dataview/41790773S9646858N1386; ComponentLink2Description: http://components.arrow.com/part/dataview/41790773S9646858N1386; ComponentLink3URL: http://nichicon-us.com/english/products/pdfs/e-ucl.pdf; ComponentLink3Description: http://nichicon-us.com/english/products/pdfs/e-ucl.pdf; ComponentLink4URL: http://www.farnell.com/datasheets/2059678.pdf; ComponentLink4Description: http://www.farnell.com/datasheets/2059678.pdf; ComponentLink5URL: http://uk.rs-online.com/webdocs/0df0/0900766b80df09a1.pdf; ComponentLink5Description: http://uk.rs-online.com/webdocs/0df0/0900766b80df09a1.pdf; ComponentLink6URL: http://www.farnell.com/datasheets/2244690.pdf; ComponentLink6Description: http://www.farnell.com/datasheets/2244690.pdf; ComponentLink7URL: https://www.alliedelec.com/m/d/f9a8f3530578bb19547681b1320b60ff.pdf; ComponentLink7Description: https://www.alliedelec.com/m/d/f9a8f3530578bb19547681b1320b60ff.pdf; ComponentLink8URL: http://industrial.panasonic.com/www-data/pdf/ABA0000/ABA0000CE114.pdf; ComponentLink8Description: http://industrial.panasonic.com/www-data/pdf/ABA0000/ABA0000CE114.pdf; ComponentLink9URL: https://www.distrelec.biz/Web/Downloads/_t/ds/fp_eng_tds.pdf?mime=application%2Fpdf; ComponentLink9Description: https://www.distrelec.biz/Web/Downloads/_t/ds/fp_eng_tds.pdf?mime=application%2Fpdf; Supplier 1: Arrow Electronics; Stock 1: 2400; Pricing 1: 600=1.58740, 900=1.54700, 1500=1.49630, 3000=1.45580, 4500=1.44550, 150=1.81500, 450=1.54600, 900=1.52090, 1500=1.47100, 3000=1.43100, 4500=1.42100, 1=2.68700, 10=2.61600, 25=2.49300 (USD); RoHS: Yes; Mount: Surface Mount,PCB; Case/Package: Radial; Min Operating Temperature: -55°C; Max Operating Temperature: 125°C; Capacitance: 680uF; Tolerance: 20%; Voltage Rating (DC): 50V; Termination: SMD/SMT; Package Quantity: 150; Voltage Rating: 50V; Packaging: Tape and Reel; Diameter: 16mm; Width: 16mm; Height: 16mm; Lead Pitch: 6.5mm; Height - Seated (Max): 0.63inch; Radiation Hardening: No; ComponentLink10URL: https://datasheet.ciiva.com/11782/0900766b81003e87-11782469.pdf?src-supplier=RSComponents; ComponentLink10Description: https://datasheet.ciiva.com/11782/0900766b81003e87-11782469.pdf?src-supplier=RSComponents; ComponentLink11URL: https://datasheet.ciiva.com/119/146cti-119936.pdf?src-supplier=Digi-Key; ComponentLink11Description: https://datasheet.ciiva.com/119/146cti-119936.pdf?src-supplier=Digi-Key; ComponentLink12URL: https://datasheet.ciiva.com/119/146cti-119934.pdf?src-supplier=Digi-Key; ComponentLink12Description: https://datasheet.ciiva.com/119/146cti-119934.pdf?src-supplier=Digi-Key; ComponentLink13URL: https://datasheet.ciiva.com/11697/146cti-11697685.pdf?src-supplier=Avnet; ComponentLink13Description: https://datasheet.ciiva.com/11697/146cti-11697685.pdf?src-supplier=Avnet; ComponentLink14URL: https://datasheet.ciiva.com/5360/146cti-247382-5360150.pdf?src-supplier=Mouser; ComponentLink14Description: https://datasheet.ciiva.com/5360/146cti-247382-5360150.pdf?src-supplier=Mouser; ComponentLink15URL: https://datasheet.ciiva.com/119/146cti-119935.pdf?src-supplier=Digi-Key; ComponentLink15Description: https://datasheet.ciiva.com/119/146cti-119935.pdf?src-supplier=Digi-Key; Supplier Part Number 1: MAL214699109E3
footprint C-E-16x16x17.5 (Aluminum Electrolytic Capacitor, Body 16.60x16.60x17.50mm, IPC Medium Density)
pins: 1, 2
text: +

## C-1000UF-16X27X7.5
designator C?, comment 1000UF  Case/Package: 16X27X7.5  Voltage: 63V
CAP ALUM 1000UF 20% 63V RADIAL; Manufacturer: Nichicon; Manufacturer Part Number: UVR1J102MHD; Dielectric Material: Aluminium; Capacitance: 1mF; Ripple Current: 1.3A; Life (Hours): 2000Hour; Leakage Current: 1.89mA; Dissipation Factor: 0.1%; Lead Diameter: 0.8mm; .Creator: F:TALI; .PCBCHK: USED; Washability: OK; Number of I/Os: 8; Supplier 1: Digi-Key; Stock 1: 14682; Pricing 1: 1=0.96, 10=0.759, 100=0.569, 500=0.42994, 1000=0.37935, 2500=0.35406, 5000=0.34142 (USD); Mount: PCB,Through Hole; Number of Pins: 2; Contact Plating: Matte,Tin; Min Operating Temperature: -40°C; Max Operating Temperature: 85°C; Tolerance: 20%; Voltage Rating (DC): 63V; Termination: Radial; Voltage Rating: 63V; Packaging: Bulk; Package Quantity: 50; Diameter: 16mm; Length: 25mm; Height: 25mm; Lead Pitch: 7.5mm; Height - Seated (Max): 0.984inch; Radiation Hardening: No; Lead Free: Lead Free; REACH SVHC: No SVHC; ComponentLink1URL: http://nichicon-us.com/english/products/pdfs/e-mi_tape.pdf?src-supplier=Digi-Key; ComponentLink1Description: http://nichicon-us.com/english/products/pdfs/e-mi_tape.pdf?src-supplier=Digi-Key; ComponentLink2URL: https://www.verical.com/server-webapp/html/getDatasheet?partID=72219&src-supplier=Verical; ComponentLink2Description: https://www.verical.com/server-webapp/html/getDatasheet?partID=72219&src-supplier=Verical; ComponentLink3URL: http://www.mouser.com/ds/2/293/e-uvr-1076495.pdf?src-supplier=Mouser; ComponentLink3Description: http://www.mouser.com/ds/2/293/e-uvr-1076495.pdf?src-supplier=Mouser; ComponentLink4URL: http://www.jameco.com/Jameco/Products/ProdDS/608964.pdf?src-supplier=Jameco; ComponentLink4Description: http://www.jameco.com/Jameco/Products/ProdDS/608964.pdf?src-supplier=Jameco; ComponentLink5URL: http://components.arrow.com/part/dataview/41714517S7196225N1432?src-supplier=Arrow; ComponentLink5Description: http://components.arrow.com/part/dataview/41714517S7196225N1432?src-supplier=Arrow; ComponentLink6URL: http://www.alliedelec.com/m/d/2079ee50b23aa24d1fe62a3e164465c7.pdf?src-supplier=Allied+Electronics; ComponentLink6Description: http://www.alliedelec.com/m/d/2079ee50b23aa24d1fe62a3e164465c7.pdf?src-supplier=Allied+Electronics; ComponentLink7URL: http://products.nichicon.co.jp/en/pdf/XJA043/e-vr.pdf?src-supplier=Future+Electronics; ComponentLink7Description: http://products.nichicon.co.jp/en/pdf/XJA043/e-vr.pdf?src-supplier=Future+Electronics; ComponentLink8URL: http://www.nichicon.co.jp/english/products/pdfs/e-vr.pdf?src-supplier=Avnet; ComponentLink8Description: http://www.nichicon.co.jp/english/products/pdfs/e-vr.pdf?src-supplier=Avnet; Supplier Part Number 1: 493-1129-ND; .SCHCHK: USED; Stock: 1976; Pricing: 1=1.6, 10=1.428, 25=1.3552, 100=1.0406, 250=0.9196, 500=0.8712, 1000=0.6776 (USD); RoHS: No; ComponentLink9URL: http://www.ti.com/lit/ds/symlink/tca6408a-q1.pdf?src-supplier=Digi-Key; ComponentLink9Description: http://www.ti.com/lit/ds/symlink/tca6408a-q1.pdf?src-supplier=Digi-Key; ComponentLink10URL: http://www.ti.com/general/docs/suppproductinfo.tsp?distId=10&amp;gotoUrl=http%3A%2F%2Fwww.ti.com%2Flit%2Fgpn%2Ftca6408a-q1&src-supplier=Digi-Key; ComponentLink10Description: http://www.ti.com/general/docs/suppproductinfo.tsp?distId=10&amp;gotoUrl=http%3A%2F%2Fwww.ti.com%2Flit%2Fgpn%2Ftca6408a-q1&src-supplier=Digi-Key
footprint C-16X27X7.5
pins: 1, 2
text: +

## C-1000uF-RADIAL
designator C?, comment 1000uF  Voltage: 50V
CAP ALUM 1000UF 20% 50V SMD; Manufacturer: Cornell Dubilier; Manufacturer Part Number: AFK108M50P44T-F; Dielectric Material: Aluminium; Dissipation Factor: 0.1%; Capacitance: 1mF; Ripple Current: 1.61A; ESR (Equivalent Series Resistance): 73mR; Life (Hours): 5000Hour; Leakage Current: 500uA; Supplier 1: Digi-Key; Supplier Part Number 1: 338-2150-1-ND; Stock: 4964; Pricing: 1=2.9, 10=2.343, 50=2.0448 (USD); RoHS: Yes; Mount: Surface Mount; Case/Package: Radial; Number of Pins: 2; Min Operating Temperature: -55°C; Max Operating Temperature: 105°C; Tolerance: 20%; Packaging: Tape and Reel; Ripple Current (AC): 1.61A; Voltage Rating: 50V; Voltage Rating (DC): 50V; Package Quantity: 1; Impedance: 73mR; Termination: SMD/SMT; Diameter: 16mm; Length: 16.5mm; Height: 16.5mm; Lead Pitch: 6.7mm; Height - Seated (Max): 0.65inch; Radiation Hardening: No; Lead Free: Lead Free; REACH SVHC: No SVHC; ComponentLink1URL: https://datasheet.ciiva.com/100/afk-100025.pdf?src-supplier=Digi-Key; ComponentLink1Description: https://datasheet.ciiva.com/100/afk-100025.pdf?src-supplier=Digi-Key; ComponentLink2URL: https://datasheet.ciiva.com/100/afk-100026.pdf?src-supplier=Digi-Key; ComponentLink2Description: https://datasheet.ciiva.com/100/afk-100026.pdf?src-supplier=Digi-Key; ComponentLink3URL: https://datasheet.ciiva.com/28458/1856883-28458744.pdf?src-supplier=Element14; ComponentLink3Description: https://datasheet.ciiva.com/28458/1856883-28458744.pdf?src-supplier=Element14; ComponentLink4URL: https://datasheet.ciiva.com/100/afk-100027.pdf?src-supplier=Digi-Key; ComponentLink4Description: https://datasheet.ciiva.com/100/afk-100027.pdf?src-supplier=Digi-Key; ComponentLink5URL: https://datasheet.ciiva.com/8063/1856883-8063758.pdf?src-supplier=Element14; ComponentLink5Description: https://datasheet.ciiva.com/8063/1856883-8063758.pdf?src-supplier=Element14
pins: 1, 2
text: +

## C-1500UF-19X19X22MM
designator C?, comment 1500UF  Case/Package: 19X19X22  Voltage Rating: 50V
CAP ALUM 1500UF 20% 50V SMD; Manufacturer: Rubycon; Manufacturer Part Number: 50TRV1500M18X21.5; Capacitance: 1.5mF; Polarity: Polar; Ripple Current: 990mA; Impedance: 72mR; Life (Hours): 10000Hour; Ripple Current (AC): 1.65A; .Creator: M.OZKAN; .PCBCHK: USED; Washability: OK; Supplier 1: Digi-Key; Stock 1: 4100; Pricing 1: 1=3.73, 10=3.01 (USD); Mount: Surface Mount; Min Operating Temperature: -40°C; Max Operating Temperature: 105°C; Packaging: Cut Tape; ESR (Equivalent Series Resistance): 72mR; Tolerance: 20%; Voltage Rating (DC): 50V; Diameter: 18mm; Height: 21.5mm; Height - Seated (Max): 0.866inch; REACH SVHC: Unknown; Supplier Part Number 1: 1189-3575-6-ND; .SCHCHK: USED
pins: 1, 2
text: +

## C-2200PF-0603
designator C?, comment 2200PF  Voltage Rating: 50V  Case Code (Imperial): 0603
CAP CER SMD 0603 2200PF 10% X7R; Manufacturer: KEMET; Manufacturer Part Number: C0603C222K5RAC7411; Dielectric Material: Ceramic; Capacitance: 2.2nF; Dissipation Factor: 2.5%; .Creator: F:TALI; .PCBCHK: USED; Washability: OK; Supplier 1: Mouser; Stock 1: 6459; Pricing 1: 1=0.11, 10=0.025, 50=0.025, 100=0.015, 1000=0.01, 10000=0.007 (USD); Mount: Surface Mount; Case/Package: 0603; Case Code (Metric): 1608; Min Operating Temperature: -55°C; Max Operating Temperature: 125°C; Tolerance: 10%; Dielectric: X7R; Package Quantity: 10000; Packaging: Tape and Reel; Voltage Rating (DC): 50V; Termination: SMD/SMT; Length: 1.6mm; Height: 0.8mm; Width: 0.8mm; Lead Pitch: 0.7mm; Depth: 0.8mm; Radiation Hardening: No; ComponentLink1URL: http://www.mouser.com/ds/2/212/KEM_C1002_X7R_SMD-1102033.pdf; ComponentLink1Description: http://www.mouser.com/ds/2/212/KEM_C1002_X7R_SMD-1102033.pdf; Supplier Part Number 1: 80-C0603C222K5R7411; .SCHCHK: USED
footprint C-0603
pins: 1, 2